# Altium footprint library 3M THD.PcbLib: 163 footprints (part 13 of 14) (continued)
## 3M_N3793-6302RB [mm] "3M, 3000 Series, 10 Contacts - Pitch 2.54mm - Straight Four-Wall Header (Black) With Long Roll Pin Latch/Ejectors" (continued)
3D body "3M_N3793-6302RB.stp": height 19.96, standoff -2.84, extent -27.128,-4.318 27.129,4.318

## 3M_N3793-6302RB_a [mm] "3M, 3000 Series, 10 Contacts - Pitch 2.54mm - Straight Four-Wall Header (Black) With Long Roll Pin Latch/Ejectors"
height 27.2
pads (12):
  round 1.6 hole 0.9: 1(-5.08,-1.27) 2(-5.08,1.27) 3(-2.54,-1.27) 4(-2.54,1.27) 5(0,-1.27) 6(0,1.27) 7(2.54,-1.27) 8(2.54,1.27) 9(5.08,-1.27) 10(5.08,1.27)
  round 4.6 hole 2.8: MTG1(-14.034,-0.256) MTG2(14.034,-0.252)
Top Overlay:
  lines w0.2: -15.998,-2.109 -15.998,-4.318 15.998,-4.318 15.998,-2.104 ; -15.998,1.596 -15.998,4.318 15.998,4.318 15.998,1.601 ; -6.35,-3.175 -5.08,-4.318 -3.81,-3.175 ; -2.03,-4.318 -2.03,-3.174 ; 2.032,-4.318 2.032,-3.174 ; 2.851,-4.318 2.851,-3.174 ; 4.767,-4.318 4.767,-3.174 ; -9.015,-3.174 -9.015,3.176 9.015,3.176 9.015,-3.174 -9.015,-3.174
  text "1" at -7.417,-2.921 h1.02
Mechanical 8:
  lines w0.1: -14.534,-0.256 -14.034,-0.256 ; -14.034,-0.756 -14.034,-0.256 ; -14.034,0.244 -14.034,-0.256 ; -13.534,-0.256 -14.034,-0.256 ; -5.58,-1.27 -5.08,-1.27 ; -5.58,1.27 -5.08,1.27 ; -5.08,-1.77 -5.08,-1.27 ; -5.08,-0.77 -5.08,-1.27 ; -5.08,0.77 -5.08,1.27 ; -5.08,1.77 -5.08,1.27 ; -4.58,-1.27 -5.08,-1.27 ; -4.58,1.27 -5.08,1.27 ; -3.04,-1.27 -2.54,-1.27 ; -3.04,1.27 -2.54,1.27 ; -2.54,-1.77 -2.54,-1.27 ; -2.54,-0.77 -2.54,-1.27 ; -2.54,0.77 -2.54,1.27 ; -2.54,1.77 -2.54,1.27 ; -2.04,-1.27 -2.54,-1.27 ; -2.04,1.27 -2.54,1.27 ; -0.5,-1.27 0,-1.27 ; -0.5,0 0,0 ; -0.5,1.27 0,1.27 ; 0,-1.77 0,-1.27 ; 0,-0.77 0,-1.27 ; 0,-0.5 0,0 ; 0,0.5 0,0 ; 0,0.77 0,1.27 ; 0,1.77 0,1.27 ; 0.5,-1.27 0,-1.27 ; 0.5,0 0,0 ; 0.5,1.27 0,1.27 ; 2.04,-1.27 2.54,-1.27 ; 2.04,1.27 2.54,1.27 ; 2.54,-1.77 2.54,-1.27 ; 2.54,-0.77 2.54,-1.27 ; 2.54,0.77 2.54,1.27 ; 2.54,1.77 2.54,1.27 ; 3.04,-1.27 2.54,-1.27 ; 3.04,1.27 2.54,1.27 ; 4.58,-1.27 5.08,-1.27 ; 4.58,1.27 5.08,1.27 ; 5.08,-1.77 5.08,-1.27 ; 5.08,-0.77 5.08,-1.27 ; 5.08,0.77 5.08,1.27 ; 5.08,1.77 5.08,1.27 ; 5.58,-1.27 5.08,-1.27 ; 5.58,1.27 5.08,1.27 ; 13.534,-0.252 14.034,-0.252 ; 14.034,-0.752 14.034,-0.252 ; 14.034,0.248 14.034,-0.252 ; 14.534,-0.252 14.034,-0.252
Mechanical 14:
  lines w0.1: -15.998,-4.318 -15.998,4.318 ; -15.998,-4.318 15.998,-4.318 ; -15.998,-4.318 -15.998,4.318 ; -15.998,-4.318 15.998,-4.318 ; -15.998,4.318 15.998,4.318 ; -15.998,4.318 15.998,4.318 ; -15.553,-1.133 -15.553,0.628 ; -15.553,-1.133 -14.719,-1.615 -15.553,-1.133 ; -15.553,-1.133 -15.553,0.628 ; -15.553,0.628 -14.719,1.109 -15.553,0.628 ; -14.719,-1.727 -14.719,1.271 ; -14.719,-1.727 -11.985,-1.727 ; -14.719,-1.727 -14.719,1.271 ; -14.719,-1.727 -11.985,-1.727 ; -14.719,1.271 -11.985,1.271 ; -14.719,1.271 -11.985,1.271 ; -14.031,-2.014 -14.526,-1.727 -14.031,-2.014 ; -14.031,-2.014 -13.535,-1.727 -14.031,-2.014 ; -14.031,1.507 -13.622,1.271 -14.031,1.507 ; -14.031,1.507 -14.439,1.271 -14.031,1.507 ; -11.985,-2.819 -11.985,-1.727 ; -11.985,-2.819 -8.759,-2.819 ; -11.985,-2.819 -11.985,-1.727 ; -11.985,-2.819 -8.759,-2.819 ; -11.985,1.271 -11.985,2.362 ; -11.985,1.271 -11.985,2.362 ; -11.985,2.362 -8.763,2.362 -11.985,2.362 ; -9.015,-3.174 9.015,-3.174 ; -9.015,-3.174 -9.015,-2.819 -9.015,-3.174 ; -9.015,-3.174 9.015,-3.174 ; -9.015,3.176 9.015,3.176 ; -9.015,3.176 -9.015,2.362 -9.015,3.176 ; -9.015,3.176 9.015,3.176 ; -8.759,-2.819 -8.759,-1.727 ; -8.759,-2.819 -8.759,-1.727 ; -8.759,-1.727 -5.713,-1.727 ; -8.759,-1.727 -5.713,-1.727 ; -8.759,1.271 -8.759,2.362 -8.759,1.271 ; -8.759,1.271 -5.713,1.271 ; -8.759,1.271 -5.713,1.271 ; -5.713,-1.727 -5.713,1.271 ; -5.713,-1.727 -5.713,1.271 ; 5.713,-1.727 5.713,1.271 ; 5.713,-1.727 8.759,-1.727 ; 5.713,-1.727 5.713,1.271 ; 5.713,-1.727 8.759,-1.727 ; 5.713,1.271 8.759,1.271 ; 5.713,1.271 8.759,1.271 ; 8.759,-2.819 8.759,-1.727 ; 8.759,-2.819 11.985,-2.819 ; 8.759,-2.819 8.759,-1.727 ; 8.759,-2.819 11.985,-2.819 ; 8.759,1.271 8.759,2.362 ; 8.759,1.271 8.759,2.362 ; 8.759,2.362 11.985,2.362 ; 8.759,2.362 11.985,2.362 ; 9.015,-3.174 9.015,-2.819 9.015,-3.174 ; 9.015,3.176 9.015,2.362 9.015,3.176 ; 11.985,-2.819 11.985,-1.727 ; 11.985,-2.819 11.985,-1.727 ; 11.985,-1.727 14.719,-1.727 ; 11.985,-1.727 14.719,-1.727 ; 11.985,1.271 11.985,2.362 ; 11.985,1.271 14.719,1.271 ; 11.985,1.271 11.985,2.362 ; 11.985,1.271 14.719,1.271 ; 14.031,-2.014 14.526,-1.727 14.031,-2.014 ; 14.031,-2.014 13.535,-1.727 14.031,-2.014 ; 14.031,1.507 13.622,1.271 14.031,1.507 ; 14.031,1.507 14.439,1.271 14.031,1.507 ; 14.719,-1.727 14.719,1.271 ; 14.719,-1.727 14.719,1.271 ; 15.553,-1.133 15.553,0.628 ; 15.553,-1.133 14.719,-1.615 15.553,-1.133 ; 15.553,-1.133 15.553,0.628 ; 15.553,0.628 14.719,1.109 15.553,0.628 ; 15.998,-4.318 15.998,4.318 ; 15.998,-4.318 15.998,4.318 ; -15.998,-3.174 -12.67,-3.174 -15.998,-3.174 ; -15.998,3.176 -12.67,3.176 -15.998,3.176 ; -12.67,-4.318 -12.67,-1.727 -12.67,-4.318 ; -12.67,1.271 -12.67,4.318 -12.67,1.271 ; -11.831,-4.318 -11.831,-2.819 -11.831,-4.318 ; -11.831,2.362 -11.831,4.318 -11.831,2.362 ; -9.395,-4.318 -9.395,-2.819 -9.395,-4.318 ; -9.395,2.362 -9.395,4.318 -9.395,2.362 ; -8.553,-4.318 -8.553,-3.174 -8.553,-4.318 ; -8.553,3.176 -8.553,4.318 -8.553,3.176 ; -2.03,-4.318 -2.03,-3.174 -2.03,-4.318 ; 2.032,-4.318 2.032,-3.174 2.032,-4.318 ; 2.851,-4.318 2.851,-3.174 2.851,-4.318 ; 4.767,-4.318 4.767,-3.174 4.767,-4.318 ; 8.553,-4.318 8.553,-3.174 8.553,-4.318 ; 8.553,3.176 8.553,4.318 8.553,3.176 ; 9.395,-4.318 9.395,-2.819 9.395,-4.318 ; 9.395,2.362 9.395,4.318 9.395,2.362 ; 11.831,-4.318 11.831,-2.819 11.831,-4.318 ; 11.831,2.362 11.831,4.318 11.831,2.362 ; 12.67,-4.318 12.67,-1.727 12.67,-4.318 ; 12.67,-3.174 15.998,-3.174 12.67,-3.174 ; 12.67,1.271 12.67,4.318 12.67,1.271 ; 12.67,3.176 15.998,3.176 12.67,3.176
3D body "3M_N3793-6302RB_a.stp": height 27.18, standoff -2.84, extent -16.002,-4.318 16.002,4.318

## 3M_N3793-D202RB [mm] "3M, 3000 Series, 2x10 Contacts - Pitch 2.54mm - Right Angle Four-Wall Condo Header (Black) With Short Roll Pin Latch/Ejectors"
height 15.5
pads (22):
  round 1.7 hole 1: 1L(-5.08,1.27) 1U(-5.08,-3.81) 2L(-5.08,3.81) 2U(-5.08,-1.27) 3L(-2.54,1.27) 3U(-2.54,-3.81) 4L(-2.54,3.81) 4U(-2.54,-1.27) 5L(0,1.27) 5U(0,-3.81) 6L(0,3.81) 6U(0,-1.27) 7L(2.54,1.27) 7U(2.54,-3.81) 8L(2.54,3.81) 8U(2.54,-1.27) 9L(5.08,1.27) 9U(5.08,-3.81) 10L(5.08,3.81) 10U(5.08,-1.27)
  round 4.6 hole 2.6: MTG1(-10.986,3.073) MTG2(10.986,3.073)
Top Overlay:
  circle w0.2: c-5.153,-5.913 r0.15
  circle w0.2: c10.668,8.915 r0.953
  circle w0.2: c-10.668,8.915 r0.953
  lines w0.2: -21.807,17.546 -17.788,15.226 -14.032,13.057 ; -16.002,0.533 -14.541,0.533 ccw(c-14.034,0.533) -13.525,0.533 -13.487,0.533 -13.487,4.518 -10.986,5.962 -8.484,4.518 -8.484,0.533 ; -15.58,8.806 -17.891,11.56 -19.401,12.432 ; -6.829,13.741 -4.763,13.741 ; -6.318,13.741 -5.048,11.542 -4.511,12.471 ; -2.857,13.741 -2.032,13.741 ; -2.851,13.741 -2.851,12.471 -4.769,12.471 -4.769,13.741 -6.794,13.741 cw(c-6.829,15.053) -8.126,14.859 -8.556,17.297 -9.398,17.297 cw(c-10.668,17.297) -11.832,16.789 -12.674,16.789 -16.002,7.645 -16.002,-5.309 16.002,-5.309 16.002,7.645 12.674,16.789 11.832,16.789 cw(c10.668,17.297) 9.398,17.297 8.556,17.297 8.126,14.859 cw(c6.829,15.053) 6.794,13.741 2.032,13.741 ; 8.484,0.533 8.484,4.518 10.986,5.962 13.487,4.518 13.487,0.533 13.525,0.533 ccw(c14.034,0.533) 14.541,0.533 16.002,0.533 ; 14.032,13.057 17.788,15.226 21.807,17.546 ; 15.58,8.806 17.891,11.56 19.401,12.432 ; -19.401,12.432 -25.033,15.684 -19.775,18.719 -16.772,16.986 -19.401,12.432 ; -2.032,6.121 2.032,6.121 ; -2.032,6.121 -2.032,13.741 ; -2.032,6.121 -2.032,13.741 ; -2.032,6.121 2.032,6.121 ; 2.032,6.121 2.032,13.741 ; 2.032,6.121 2.032,13.741 ; 19.401,12.432 25.033,15.684 19.775,18.719 16.772,16.986 19.401,12.432 ; -2.032,7.645 2.032,7.645 -2.032,7.645
  text "1" at -7.112,0.84 h1.02
  text "LOWER" at -7.685,5.465 h1
  text "1" at -7.112,-4.24 h1.02
  text "UPPER" at -12.59,-4.25 h1
  text "10" at 6.34,-1.651 h1.02
  text "10" at 6.34,3.429 h1.02
Mechanical 8:
  lines w0.05: -11.485,3.073 -10.986,3.073 ; -10.986,2.573 -10.986,3.073 ; -10.986,3.573 -10.986,3.073 ; -10.486,3.073 -10.986,3.073 ; -5.58,-3.81 -5.08,-3.81 ; -5.58,-1.27 -5.08,-1.27 ; -5.58,1.27 -5.08,1.27 ; -5.58,3.81 -5.08,3.81 ; -5.08,-4.31 -5.08,-3.81 ; -5.08,-3.31 -5.08,-3.81 ; -5.08,-1.77 -5.08,-1.27 ; -5.08,-0.77 -5.08,-1.27 ; -5.08,0.77 -5.08,1.27 ; -5.08,1.77 -5.08,1.27 ; -5.08,3.31 -5.08,3.81 ; -5.08,4.31 -5.08,3.81 ; -4.58,-3.81 -5.08,-3.81 ; -4.58,-1.27 -5.08,-1.27 ; -4.58,1.27 -5.08,1.27 ; -4.58,3.81 -5.08,3.81 ; -3.04,-3.81 -2.54,-3.81 ; -3.04,-1.27 -2.54,-1.27 ; -3.04,1.27 -2.54,1.27 ; -3.04,3.81 -2.54,3.81 ; -2.54,-4.31 -2.54,-3.81 ; -2.54,-3.31 -2.54,-3.81 ; -2.54,-1.77 -2.54,-1.27 ; -2.54,-0.77 -2.54,-1.27 ; -2.54,0.77 -2.54,1.27 ; -2.54,1.77 -2.54,1.27 ; -2.54,3.31 -2.54,3.81 ; -2.54,4.31 -2.54,3.81 ; -2.04,-3.81 -2.54,-3.81 ; -2.04,-1.27 -2.54,-1.27 ; -2.04,1.27 -2.54,1.27 ; -2.04,3.81 -2.54,3.81 ; -0.5,-3.81 0,-3.81 ; -0.5,-1.27 0,-1.27 ; -0.5,1.27 0,1.27 ; -0.5,3.81 0,3.81 ; 0,-4.31 0,-3.81 ; 0,-3.31 0,-3.81 ; 0,-1.77 0,-1.27 ; 0,-0.77 0,-1.27 ; 0,0.77 0,1.27 ; 0,1.77 0,1.27 ; 0,3.31 0,3.81 ; 0,4.31 0,3.81 ; 0.5,-3.81 0,-3.81 ; 0.5,-1.27 0,-1.27 ; 0.5,1.27 0,1.27 ; 0.5,3.81 0,3.81 ; 2.04,-3.81 2.54,-3.81 ; 2.04,-1.27 2.54,-1.27 ; 2.04,1.27 2.54,1.27 ; 2.04,3.81 2.54,3.81 ; 2.54,-4.31 2.54,-3.81 ; 2.54,-3.31 2.54,-3.81 ; 2.54,-1.77 2.54,-1.27 ; 2.54,-0.77 2.54,-1.27 ; 2.54,0.77 2.54,1.27 ; 2.54,1.77 2.54,1.27 ; 2.54,3.31 2.54,3.81 ; 2.54,4.31 2.54,3.81 ; 3.04,-3.81 2.54,-3.81 ; 3.04,-1.27 2.54,-1.27 ; 3.04,1.27 2.54,1.27 ; 3.04,3.81 2.54,3.81 ; 4.58,-3.81 5.08,-3.81 ; 4.58,-1.27 5.08,-1.27 ; 4.58,1.27 5.08,1.27 ; 4.58,3.81 5.08,3.81 ; 5.08,-4.31 5.08,-3.81 ; 5.08,-3.31 5.08,-3.81 ; 5.08,-1.77 5.08,-1.27 ; 5.08,-0.77 5.08,-1.27 ; 5.08,0.77 5.08,1.27 ; 5.08,1.77 5.08,1.27 ; 5.08,3.31 5.08,3.81 ; 5.08,4.31 5.08,3.81 ; 5.58,-3.81 5.08,-3.81 ; 5.58,-1.27 5.08,-1.27 ; 5.58,1.27 5.08,1.27 ; 5.58,3.81 5.08,3.81 ; 10.486,3.073 10.986,3.073 ; 10.986,2.573 10.986,3.073 ; 10.986,3.573 10.986,3.073 ; 11.485,3.073 10.986,3.073 ; 0,0 -0.5,0 0,0 ; 0,0 0,-0.5 0,0 ; 0,0 0.5,0 0,0 ; 0,0 0,0.5 0,0
Mechanical 14:
  circle w0.1: c10.668,8.915 r0.953
  circle w0.1: c-10.668,8.915 r0.953
  circle w0.1: c10.986,3.073 r1.27
  circle w0.1: c-10.986,3.073 r1.27
  lines w0.1: -21.807,17.546 -17.788,15.226 -14.032,13.057 ; -15.58,8.806 -17.891,11.56 -19.401,12.432 ; -8.484,0.533 -8.484,4.518 -10.986,5.962 -13.487,4.518 -13.487,0.533 -13.525,0.533 cw(c-14.034,0.533) -14.541,0.533 -16.002,0.533 16.002,0.533 14.541,0.533 cw(c14.034,0.533) 13.525,0.533 13.487,0.533 13.487,4.518 10.986,5.962 8.484,4.518 8.484,0.533 ; -6.829,13.741 -4.763,13.741 ; -6.318,13.741 -5.048,11.542 -4.511,12.471 ; -2.857,13.741 -2.032,13.741 ; -2.851,13.741 -2.851,12.471 -4.769,12.471 -4.769,13.741 -6.794,13.741 cw(c-6.829,15.053) -8.126,14.859 -8.556,17.297 -9.398,17.297 cw(c-10.668,17.297) -11.832,16.789 -12.674,16.789 -16.002,7.645 -16.002,-5.309 16.002,-5.309 16.002,7.645 12.674,16.789 11.832,16.789 cw(c10.668,17.297) 9.398,17.297 8.556,17.297 8.126,14.859 cw(c6.829,15.053) 6.794,13.741 2.032,13.741 ; 14.032,13.057 17.788,15.226 21.807,17.546 ; 15.58,8.806 17.891,11.56 19.401,12.432 ; -19.401,12.432 -25.033,15.684 -19.775,18.719 -16.772,16.986 -19.401,12.432 ; -2.032,6.121 2.032,6.121 ; -2.032,6.121 -2.032,13.741 ; -2.032,6.121 -2.032,13.741 ; -2.032,6.121 2.032,6.121 ; 2.032,6.121 2.032,13.741 ; 2.032,6.121 2.032,13.741 ; 19.401,12.432 25.033,15.684 19.775,18.719 16.772,16.986 19.401,12.432 ; -2.032,7.645 2.032,7.645 -2.032,7.645
  text "10" at 6.34,-1.651 h1.02
  text "10" at 6.34,3.429 h1.02
  text "UPPER" at -12.59,-4.25 h1
  text "1" at -7.112,-4.24 h1.02
  text "LOWER" at -7.685,5.465 h1
  text "1" at -7.112,0.84 h1.02
3D body "3M_N3793-D202RB.stp": height 15.49, standoff -2.84, extent -24.931,-5.308 24.931,18.719

## 3M_N3793-D202RB_a [mm] "3M, 3000 Series, 2x10 Contacts - Pitch 2.54mm - Right Angle Four-Wall Condo Header (Black) With Short Roll Pin Latch/Ejectors"
height 15.5
pads (22):
  round 1.7 hole 1: 1L(-5.08,1.27) 1U(-5.08,-3.81) 2L(-5.08,3.81) 2U(-5.08,-1.27) 3L(-2.54,1.27) 3U(-2.54,-3.81) 4L(-2.54,3.81) 4U(-2.54,-1.27) 5L(0,1.27) 5U(0,-3.81) 6L(0,3.81) 6U(0,-1.27) 7L(2.54,1.27) 7U(2.54,-3.81) 8L(2.54,3.81) 8U(2.54,-1.27) 9L(5.08,1.27) 9U(5.08,-3.81) 10L(5.08,3.81) 10U(5.08,-1.27)
  round 4.6 hole 2.6: MTG1(-10.986,3.073) MTG2(10.986,3.073)
Top Overlay:
  circle w0.2: c-5.153,-5.913 r0.15
  circle w0.2: c10.668,8.915 r0.953
  circle w0.2: c-10.668,8.915 r0.953
  lines w0.2: -16.002,0.533 -14.541,0.533 ccw(c-14.034,0.533) -13.525,0.533 -13.487,0.533 -13.487,4.518 -10.986,5.962 -8.484,4.518 -8.484,0.533 ; -11.989,16.789 -11.989,24.74 -6.731,21.704 -6.731,18.237 -11.989,18.237 ; -8.763,17.297 -8.763,22.877 ; -6.829,13.741 -4.763,13.741 ; -6.318,13.741 -5.048,11.542 -4.511,12.471 ; -2.857,13.741 -2.032,13.741 ; -2.851,13.741 -2.851,12.471 -4.769,12.471 -4.769,13.741 -6.794,13.741 cw(c-6.829,15.053) -8.126,14.859 -8.556,17.297 -9.398,17.297 cw(c-10.668,17.297) -11.832,16.789 -12.674,16.789 -16.002,7.645 -16.002,-5.309 16.002,-5.309 16.002,7.645 12.674,16.789 11.832,16.789 cw(c10.668,17.297) 9.398,17.297 8.556,17.297 8.126,14.859 cw(c6.829,15.053) 6.794,13.741 2.032,13.741 ; 8.484,0.533 8.484,4.518 10.986,5.962 13.487,4.518 13.487,0.533 13.525,0.533 ccw(c14.034,0.533) 14.541,0.533 16.002,0.533 ; 8.763,17.297 8.763,22.877 ; 11.989,16.789 11.989,24.74 6.731,21.704 6.731,18.237 11.989,18.237 ; -2.032,6.121 2.032,6.121 ; -2.032,6.121 -2.032,13.741 ; -2.032,6.121 -2.032,13.741 ; -2.032,6.121 2.032,6.121 ; 2.032,6.121 2.032,13.741 ; 2.032,6.121 2.032,13.741 ; -2.032,7.645 2.032,7.645 -2.032,7.645
  text "1" at -7.112,0.84 h1.02
  text "LOWER" at -7.685,5.465 h1
  text "1" at -7.112,-4.24 h1.02
  text "UPPER" at -12.59,-4.25 h1
  text "10" at 6.34,-1.651 h1.02
  text "10" at 6.34,3.429 h1.02
Mechanical 8:
  lines w0.05: -11.485,3.073 -10.986,3.073 ; -10.986,2.573 -10.986,3.073 ; -10.986,3.573 -10.986,3.073 ; -10.486,3.073 -10.986,3.073 ; -5.58,-3.81 -5.08,-3.81 ; -5.58,-1.27 -5.08,-1.27 ; -5.58,1.27 -5.08,1.27 ; -5.58,3.81 -5.08,3.81 ; -5.08,-4.31 -5.08,-3.81 ; -5.08,-3.31 -5.08,-3.81 ; -5.08,-1.77 -5.08,-1.27 ; -5.08,-0.77 -5.08,-1.27 ; -5.08,0.77 -5.08,1.27 ; -5.08,1.77 -5.08,1.27 ; -5.08,3.31 -5.08,3.81 ; -5.08,4.31 -5.08,3.81 ; -4.58,-3.81 -5.08,-3.81 ; -4.58,-1.27 -5.08,-1.27 ; -4.58,1.27 -5.08,1.27 ; -4.58,3.81 -5.08,3.81 ; -3.04,-3.81 -2.54,-3.81 ; -3.04,-1.27 -2.54,-1.27 ; -3.04,1.27 -2.54,1.27 ; -3.04,3.81 -2.54,3.81 ; -2.54,-4.31 -2.54,-3.81 ; -2.54,-3.31 -2.54,-3.81 ; -2.54,-1.77 -2.54,-1.27 ; -2.54,-0.77 -2.54,-1.27 ; -2.54,0.77 -2.54,1.27 ; -2.54,1.77 -2.54,1.27 ; -2.54,3.31 -2.54,3.81 ; -2.54,4.31 -2.54,3.81 ; -2.04,-3.81 -2.54,-3.81 ; -2.04,-1.27 -2.54,-1.27 ; -2.04,1.27 -2.54,1.27 ; -2.04,3.81 -2.54,3.81 ; -0.5,-3.81 0,-3.81 ; -0.5,-1.27 0,-1.27 ; -0.5,1.27 0,1.27 ; -0.5,3.81 0,3.81 ; 0,-4.31 0,-3.81 ; 0,-3.31 0,-3.81 ; 0,-1.77 0,-1.27 ; 0,-0.77 0,-1.27 ; 0,0.77 0,1.27 ; 0,1.77 0,1.27 ; 0,3.31 0,3.81 ; 0,4.31 0,3.81 ; 0.5,-3.81 0,-3.81 ; 0.5,-1.27 0,-1.27 ; 0.5,1.27 0,1.27 ; 0.5,3.81 0,3.81 ; 2.04,-3.81 2.54,-3.81 ; 2.04,-1.27 2.54,-1.27 ; 2.04,1.27 2.54,1.27 ; 2.04,3.81 2.54,3.81 ; 2.54,-4.31 2.54,-3.81 ; 2.54,-3.31 2.54,-3.81 ; 2.54,-1.77 2.54,-1.27 ; 2.54,-0.77 2.54,-1.27 ; 2.54,0.77 2.54,1.27 ; 2.54,1.77 2.54,1.27 ; 2.54,3.31 2.54,3.81 ; 2.54,4.31 2.54,3.81 ; 3.04,-3.81 2.54,-3.81 ; 3.04,-1.27 2.54,-1.27 ; 3.04,1.27 2.54,1.27 ; 3.04,3.81 2.54,3.81 ; 4.58,-3.81 5.08,-3.81 ; 4.58,-1.27 5.08,-1.27 ; 4.58,1.27 5.08,1.27 ; 4.58,3.81 5.08,3.81 ; 5.08,-4.31 5.08,-3.81 ; 5.08,-3.31 5.08,-3.81 ; 5.08,-1.77 5.08,-1.27 ; 5.08,-0.77 5.08,-1.27 ; 5.08,0.77 5.08,1.27 ; 5.08,1.77 5.08,1.27 ; 5.08,3.31 5.08,3.81 ; 5.08,4.31 5.08,3.81 ; 5.58,-3.81 5.08,-3.81 ; 5.58,-1.27 5.08,-1.27 ; 5.58,1.27 5.08,1.27 ; 5.58,3.81 5.08,3.81 ; 10.486,3.073 10.986,3.073 ; 10.986,2.573 10.986,3.073 ; 10.986,3.573 10.986,3.073 ; 11.485,3.073 10.986,3.073 ; 0,0 -0.5,0 0,0 ; 0,0 0,-0.5 0,0 ; 0,0 0.5,0 0,0 ; 0,0 0,0.5 0,0
Mechanical 14:
  circle w0.1: c10.668,8.915 r0.953
  circle w0.1: c-10.668,8.915 r0.953
  circle w0.1: c10.986,3.073 r1.27
  circle w0.1: c-10.986,3.073 r1.27
  lines w0.1: -11.989,16.789 -11.989,24.74 -6.731,21.704 -6.731,18.237 -11.989,18.237 ; -8.763,17.297 -8.763,22.877 ; -8.484,0.533 -8.484,4.518 -10.986,5.962 -13.487,4.518 -13.487,0.533 -13.525,0.533 cw(c-14.034,0.533) -14.541,0.533 -16.002,0.533 16.002,0.533 14.541,0.533 cw(c14.034,0.533) 13.525,0.533 13.487,0.533 13.487,4.518 10.986,5.962 8.484,4.518 8.484,0.533 ; -6.829,13.741 -4.763,13.741 ; -6.318,13.741 -5.048,11.542 -4.511,12.471 ; -2.857,13.741 -2.032,13.741 ; -2.851,13.741 -2.851,12.471 -4.769,12.471 -4.769,13.741 -6.794,13.741 cw(c-6.829,15.053) -8.126,14.859 -8.556,17.297 -9.398,17.297 cw(c-10.668,17.297) -11.832,16.789 -12.674,16.789 -16.002,7.645 -16.002,-5.309 16.002,-5.309 16.002,7.645 12.674,16.789 11.832,16.789 cw(c10.668,17.297) 9.398,17.297 8.556,17.297 8.126,14.859 cw(c6.829,15.053) 6.794,13.741 2.032,13.741 ; 8.763,17.297 8.763,22.877 ; 11.989,16.789 11.989,24.74 6.731,21.704 6.731,18.237 11.989,18.237 ; -2.032,6.121 2.032,6.121 ; -2.032,6.121 -2.032,13.741 ; -2.032,6.121 -2.032,13.741 ; -2.032,6.121 2.032,6.121 ; 2.032,6.121 2.032,13.741 ; 2.032,6.121 2.032,13.741 ; -2.032,7.645 2.032,7.645 -2.032,7.645
  text "10" at 6.34,-1.651 h1.02
  text "10" at 6.34,3.429 h1.02
  text "UPPER" at -12.59,-4.25 h1
  text "1" at -7.112,-4.24 h1.02
  text "LOWER" at -7.685,5.465 h1
  text "1" at -7.112,0.84 h1.02
3D body "3M_N3793-D202RB_a.stp": height 15.49, standoff -2.84, extent -16.002,-5.308 16.002,24.665

## 3M_N10220-5212PC [mm] "20 contacts, Mini D Ribbon (MDR), 102 Series, .050\" Boardmount Through-hole Right Angle Receptacle-Shielded"
height 9.4
pads (22):
  round 1.4 hole 0.8: 1(-5.715,-4.826) 2(-4.445,-2.921) 3(-3.175,-4.826) 4(-1.905,-2.921) 5(-0.635,-4.826) 6(0.635,-2.921) 7(1.905,-4.826) 8(3.175,-2.921) 9(4.445,-4.826) 10(5.715,-2.921) 11(-5.715,-1.016) 12(-4.445,0.889) 13(-3.175,-1.016) 14(-1.905,0.889) 15(-0.635,-1.016) 16(0.635,0.889) 17(1.905,-1.016) 18(3.175,0.889) 19(4.445,-1.016) 20(5.715,0.889)
  round 5.5 hole 2.8: 21(-13.716,-2.921) 22(13.716,-2.921)
Top Overlay:
  circle w0.3: c-5.715,-6.35 r0.15
  lines w0.2: -16.637,-4.578 -16.637,-5.715 -15.5,-5.715 ; -16.637,-1.5 -16.637,5.715 16.637,5.715 16.637,-1.5 ; -12,-5.715 12,-5.715 ; -10.414,5.715 -10.414,10.541 ; -10.414,9.271 -11.684,9.271 -11.684,9.906 -11.049,10.541 -10.414,10.541 ; -9.525,-5.715 -9.525,2.159 9.525,2.159 9.525,-5.715 ; -9.144,5.715 -9.144,10.541 -10.414,10.541 ; -8.212,5.715 -8.212,11.049 8.212,11.049 8.212,5.715 ; 9.144,5.715 9.144,10.541 10.414,10.541 ; 10.414,5.715 10.414,10.541 ; 10.414,9.271 11.684,9.271 11.684,9.906 11.049,10.541 10.414,10.541 ; 15.5,-5.715 16.637,-5.715 16.637,-4.578
  text "1" at -7.225,-5.31 h1.02
  text "2" at -6.605,-3.405 h1.02
  text "12" at -7.255,0.405 h1.02
  text "11" at -8.025,-1.5 h1.02
  text "19" at 5.705,-1.505 h1.02
  text "9" at 5.727,-5.293 h1.02
  text "10" at 6.8,-3.435 h1.02
  text "20" at 6.8,0.375 h1.02
Mechanical 8:
  lines w0.1: -14.216,-2.921 -13.716,-2.921 ; -13.716,-3.421 -13.716,-2.921 ; -13.716,-2.421 -13.716,-2.921 ; -13.216,-2.921 -13.716,-2.921 ; -6.215,-4.826 -5.715,-4.826 ; -6.215,-1.016 -5.715,-1.016 ; -5.715,-5.326 -5.715,-4.826 ; -5.715,-4.326 -5.715,-4.826 ; -5.215,-4.826 -5.715,-4.826 ; -5.215,-1.016 -5.715,-1.016 ; -4.945,-2.921 -4.445,-2.921 ; -4.945,0.889 -4.445,0.889 ; -4.445,-3.421 -4.445,-2.921 ; -4.445,-2.421 -4.445,-2.921 ; -4.445,0.389 -4.445,0.889 ; -4.445,1.389 -4.445,0.889 ; -3.945,-2.921 -4.445,-2.921 ; -3.945,0.889 -4.445,0.889 ; -3.675,-4.826 -3.175,-4.826 ; -3.675,-1.016 -3.175,-1.016 ; -3.175,-5.326 -3.175,-4.826 ; -3.175,-4.326 -3.175,-4.826 ; -2.675,-4.826 -3.175,-4.826 ; -2.675,-1.016 -3.175,-1.016 ; -2.405,-2.921 -1.905,-2.921 ; -2.405,0.889 -1.905,0.889 ; -1.905,-3.421 -1.905,-2.921 ; -1.905,-2.421 -1.905,-2.921 ; -1.905,0.389 -1.905,0.889 ; -1.905,1.389 -1.905,0.889 ; -1.405,-2.921 -1.905,-2.921 ; -1.405,0.889 -1.905,0.889 ; -1.135,-4.826 -0.635,-4.826 ; -1.135,-1.016 -0.635,-1.016 ; -0.635,-5.326 -0.635,-4.826 ; -0.635,-4.326 -0.635,-4.826 ; -0.5,0 0,0 ; -0.135,-4.826 -0.635,-4.826 ; -0.135,-1.016 -0.635,-1.016 ; 0.135,-2.921 0.635,-2.921 ; 0.135,0.889 0.635,0.889 ; 0.5,0 0,0 ; 0.635,-3.421 0.635,-2.921 ; 0.635,-2.421 0.635,-2.921 ; 0.635,0.389 0.635,0.889 ; 0.635,1.389 0.635,0.889 ; 1.135,-2.921 0.635,-2.921 ; 1.135,0.889 0.635,0.889 ; 1.405,-4.826 1.905,-4.826 ; 1.405,-1.016 1.905,-1.016 ; 1.905,-5.326 1.905,-4.826 ; 1.905,-4.326 1.905,-4.826 ; 2.405,-4.826 1.905,-4.826 ; 2.405,-1.016 1.905,-1.016 ; 2.675,-2.921 3.175,-2.921 ; 2.675,0.889 3.175,0.889 ; 3.175,-3.421 3.175,-2.921 ; 3.175,-2.421 3.175,-2.921 ; 3.175,0.389 3.175,0.889 ; 3.175,1.389 3.175,0.889 ; 3.675,-2.921 3.175,-2.921 ; 3.675,0.889 3.175,0.889 ; 3.945,-4.826 4.445,-4.826 ; 3.945,-1.016 4.445,-1.016 ; 4.445,-5.326 4.445,-4.826 ; 4.445,-4.326 4.445,-4.826 ; 4.945,-4.826 4.445,-4.826 ; 4.945,-1.016 4.445,-1.016 ; 5.215,-2.921 5.715,-2.921 ; 5.215,0.889 5.715,0.889 ; 5.715,-3.421 5.715,-2.921 ; 5.715,-2.421 5.715,-2.921 ; 5.715,0.389 5.715,0.889 ; 5.715,1.389 5.715,0.889 ; 6.215,-2.921 5.715,-2.921 ; 6.215,0.889 5.715,0.889 ; 13.216,-2.921 13.716,-2.921 ; 13.716,-3.421 13.716,-2.921 ; 13.716,-2.421 13.716,-2.921 ; 14.216,-2.921 13.716,-2.921 ; -5.715,-1.016 -5.715,-0.516 -5.715,-1.016 ; -5.715,-1.016 -5.715,-1.516 -5.715,-1.016 ; -3.175,-1.016 -3.175,-0.516 -3.175,-1.016 ; -3.175,-1.016 -3.175,-1.516 -3.175,-1.016 ; -0.635,-1.016 -0.635,-0.516 -0.635,-1.016 ; -0.635,-1.016 -0.635,-1.516 -0.635,-1.016 ; 0,0 0,0.5 0,0 ; 0,0 0,-0.5 0,0 ; 1.905,-1.016 1.905,-0.516 1.905,-1.016 ; 1.905,-1.016 1.905,-1.516 1.905,-1.016 ; 4.445,-1.016 4.445,-0.516 4.445,-1.016 ; 4.445,-1.016 4.445,-1.516 4.445,-1.016
Mechanical 14:
  circle w0.1: c-13.716,-2.921 r1.245
  circle w0.1: c13.716,-2.921 r1.245
  circle w0.3: c-5.715,-6.35 r0.15
  lines w0.1: -16.637,-5.715 -16.637,5.715 16.637,5.715 16.637,-5.715 ; -16.637,2.159 -10.795,2.159 -10.795,-5.715 ; -13.97,-4.139 -13.97,-5.099 -13.462,-5.099 -13.462,-4.139 ; -13.97,-1.703 -13.97,-0.743 -13.462,-0.743 -13.462,-1.703 ; -10.414,5.715 -10.414,10.541 ; -10.414,9.271 -11.684,9.271 -11.684,9.906 -11.049,10.541 -10.414,10.541 ; -9.525,-5.715 -9.525,2.159 9.525,2.159 9.525,-5.715 ; -9.144,5.715 -9.144,10.541 -10.414,10.541 ; -8.212,5.715 -8.212,11.049 8.212,11.049 8.212,5.715 ; 9.144,5.715 9.144,10.541 10.414,10.541 ; 10.414,5.715 10.414,10.541 ; 10.414,9.271 11.684,9.271 11.684,9.906 11.049,10.541 10.414,10.541 ; 10.795,-5.715 10.795,2.159 16.637,2.159 ; 13.462,-4.139 13.462,-5.099 13.97,-5.099 13.97,-4.139 ; 13.462,-1.703 13.462,-0.743 13.97,-0.743 13.97,-1.703
  text "1" at -7.225,-5.31 h1.02
  text "2" at -6.605,-3.405 h1.02
  text "12" at -7.255,0.405 h1.02
  text "11" at -8.025,-1.5 h1.02
  text "19" at 5.705,-1.505 h1.02
  text "9" at 5.727,-5.293 h1.02
  text "10" at 6.8,-3.435 h1.02
  text "20" at 6.8,0.375 h1.02
3D body "3M_N10220-5212PC.stp": height 9.4, standoff -3.81, extent -16.637,-5.715 16.637,11.049